# Altium footprint library mainlib.PcbLib: 95 footprints (part 4 of 6)
Each footprint in its own frame and in the unit in brackets; x right, y up, seen from the top. Pads: shape width x height; smd on the part's side, far side on the other; paste and mask are expansions set on the pad; w line width, h text height; cw(c..) or ccw(c..) is an arc to the next point about the centre after c.
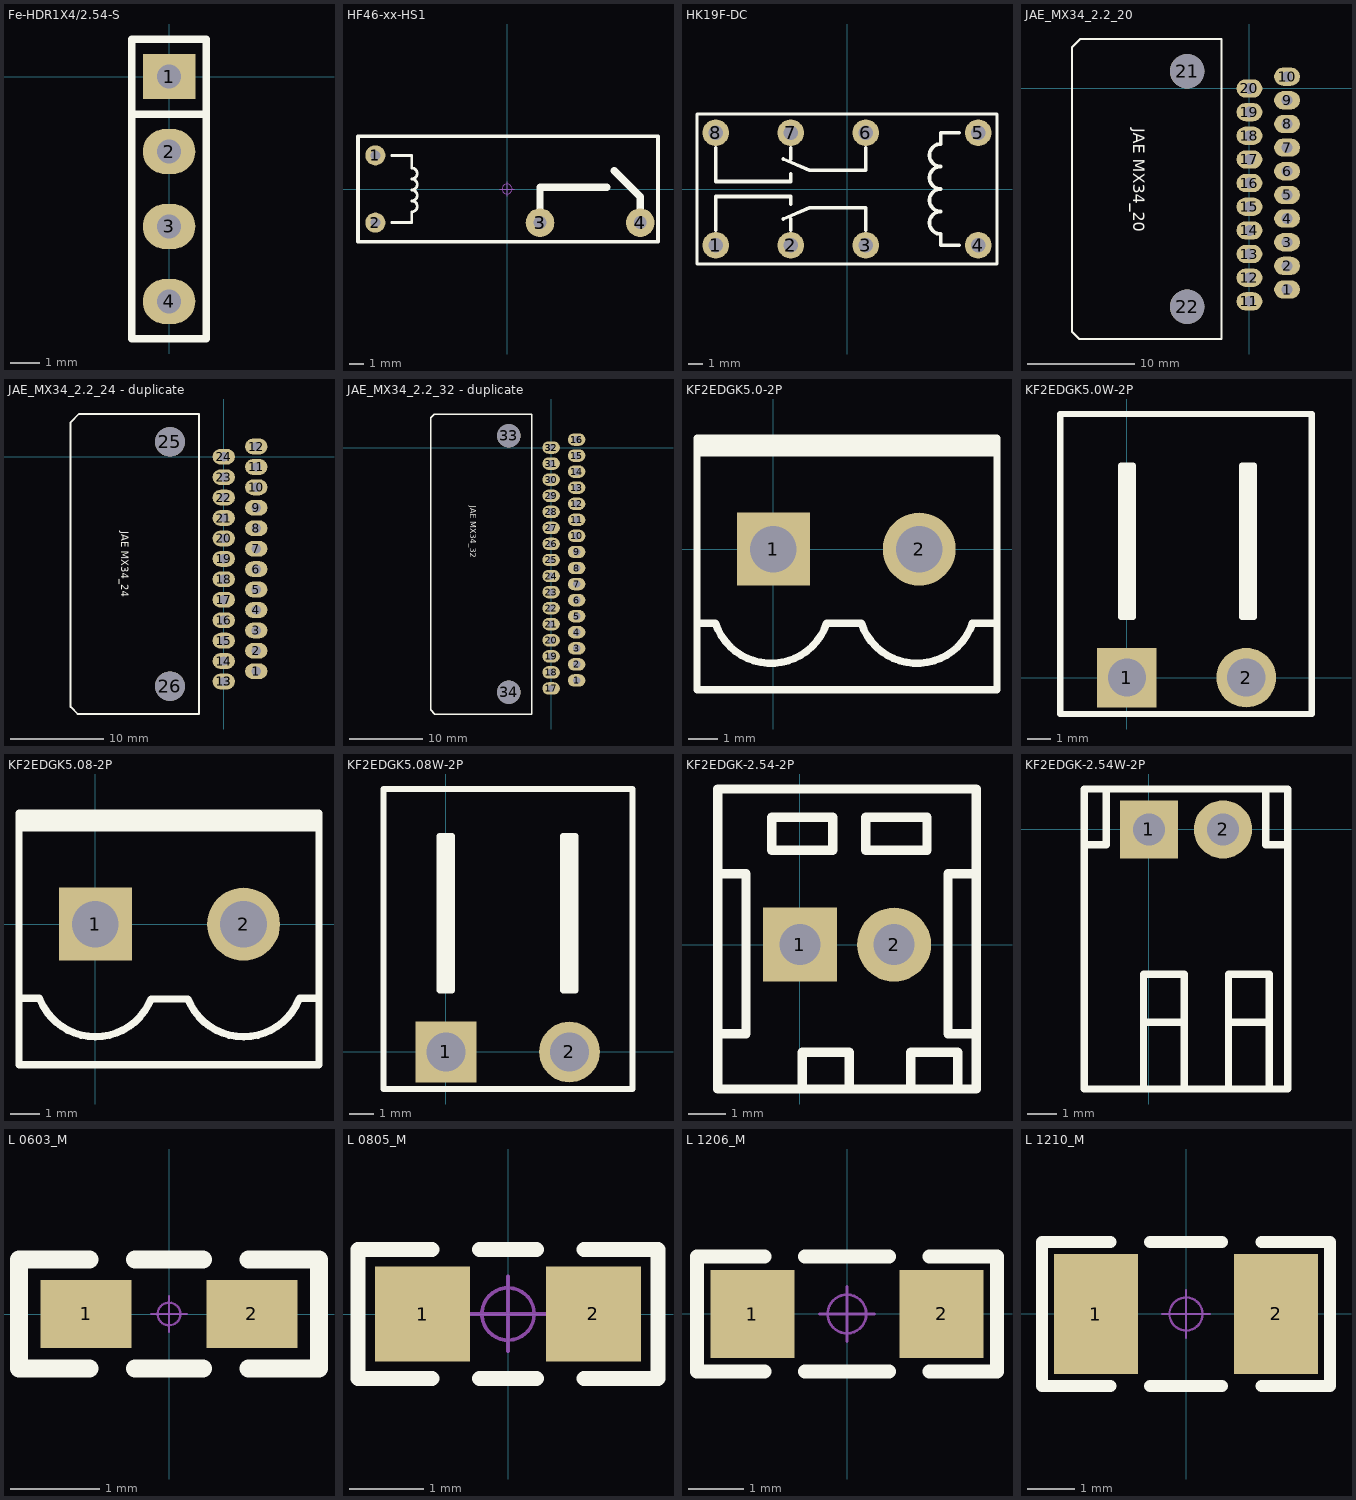
[diagram p3: the footprints below, top view; thin cyan lines are the x and y axes]

## Fe-HDR1X4/2.54-S [mil]
pads (4):
  rect 70x60 hole 32: 1(0,0)
  oval 70x60 hole 32: 2(0,-100) 3(0,-200) 4(0,-300)
Top Overlay:
  lines w10: -50,-50 50,-50 ; -50,-350 -50,50 50,50 50,-350 -50,-350
3D body "Female-Header-2.54-Single-4.stp": height 334.65, standoff -125.98, extent -44.21,-354.92 54.22,54.92

## HF46-xx-HS1 [mm] "一组常开，长：20.5mm，宽：7mm，高：15.3mm"
pads (4):
  round 1.4 hole 0.7: 1(-9.2,2.35) 2(-9.2,-2.35)
  round 2 hole 0.9: 3(2.3,-2.35) 4(9.3,-2.35)
Top Overlay:
  lines w0.2: -8.057,-2.35 -6.66,-2.35 -6.66,-1.59 ccw(c-6.66,-1.208) -6.66,-0.826 ccw(c-6.66,-0.444) -6.66,-0.062 ccw(c-6.66,0.32) -6.66,0.702 ccw(c-6.66,1.084) -6.66,1.466 -6.66,2.35 -8.057,2.35
  lines w0.254: -10.414,-3.683 10.541,-3.683 10.541,3.683 -10.414,3.683 -10.414,-3.683
  lines w0.508: 2.3,-2.35 2.3,0.113 2.314,0.127 6.985,0.127 ; 7.493,1.27 9.3,-0.537 9.3,-2.35
Mechanical 15:
  circle w0.05: c0,0 r0.35
  lines w0.05: -0.5,0 0.5,0 ; 0,-0.5 0,0.5
3D body "HF46-xx-HS1.STEP": height 15.3, standoff -2.6, extent -10.25,-3.5 10.25,3.5

## HK19F-DC [mm] "单刀双投，长：20.2mm，宽：10mm，高：12mm"
pads (8):
  round 1.8 hole 1: 1(-8.89,-3.81) 2(-3.81,-3.81) 3(1.27,-3.81) 4(8.89,-3.81) 5(8.89,3.81) 6(1.27,3.81) 7(-3.81,3.81) 8(-8.89,3.81)
Top Overlay:
  lines w0.2: -10.16,-5.08 -10.16,5.08 10.16,5.08 10.16,-5.08 -10.16,-5.08
  lines w0.254: -8.89,-2.794 -8.89,-0.508 -3.81,-0.508 -3.81,-1.016 ; -8.89,2.794 -8.89,0.508 -3.81,0.508 -3.81,1.016 ; -4.318,-2.032 -2.54,-1.27 1.27,-1.27 1.27,-2.794 ; -4.318,2.032 -2.54,1.27 1.27,1.27 1.27,2.794 ; -3.81,-2.794 -3.81,-2.032 ; -3.81,2.032 -3.81,2.794 ; 7.588,-3.81 6.35,-3.81 6.35,-3.048 cw(c6.35,-2.286) 6.35,-1.524 cw(c6.35,-0.762) 6.35,0 cw(c6.35,0.762) 6.35,1.524 cw(c6.35,2.286) 6.35,3.048 6.35,3.81 7.588,3.81
3D body "HK19F-DC-.STEP": height 11.85, standoff -3.25, extent -10.1,-5.047 10.1,4.953

## JAE_MX34_2.2_20 [mm]
pads (24):
  oval 2.4x1.7 hole 1: 1(3.5,-18.7) 1(3.5,-18.7) 2(3.5,-16.5) 3(3.5,-14.3) 4(3.5,-12.1) 5(3.5,-9.9) 6(3.5,-7.7) 7(3.5,-5.5) 8(3.5,-3.3) 9(3.5,-1.1) 10(3.5,1.1) 11(0,-19.8) 11(0,-19.8) 12(0,-17.6) 13(0,-15.4) 14(0,-13.2) 15(0,-11) 16(0,-8.8) 17(0,-6.6) 18(0,-4.4) 19(0,-2.2) 20(0,0)
  round 3.2 hole 3.2 unplated: 21(-5.8,1.6) 22(-5.8,-20.3)
Top Overlay:
  lines w0.2: -16.5,-22.616 -16.5,-1.1 -16.5,3.82 -15.72,4.6 -5.8,4.6 -2.608,4.6 -2.608,-23.3 -5.8,-23.3 -15.816,-23.3 -16.5,-22.616
  text "JAE MX34_20" at -10.795,-3.683 h1.1

## JAE_MX34_2.2_24 - duplicate [mm]
pads (28):
  oval 2.4x1.7 hole 1: 1(3.5,-23.1) 1(3.5,-23.1) 2(3.5,-20.9) 3(3.5,-18.7) 4(3.5,-16.5) 5(3.5,-14.3) 6(3.5,-12.1) 7(3.5,-9.9) 8(3.5,-7.7) 9(3.5,-5.5) 10(3.5,-3.3) 11(3.5,-1.1) 12(3.5,1.1) 13(0,-24.2) 13(0,-24.2) 14(0,-22) 15(0,-19.8) 16(0,-17.6) 17(0,-15.4) 18(0,-13.2) 19(0,-11) 20(0,-8.8) 21(0,-6.6) 22(0,-4.4) 23(0,-2.2) 24(0,0)
  round 3.2 hole 3.2 unplated: 25(-5.8,1.6) 26(-5.8,-24.7)
Top Overlay:
  lines w0.2: -16.5,-26.934 -15.734,-27.7 -2.653,-27.7 -2.653,4.6 -5.8,4.6 -15.593,4.6 -16.5,3.693 -16.5,-26.934
  text "JAE MX34_24" at -11.049,-8.001 h0.8
3D body "111.STEP": height 16.05, standoff -3.15, extent -22.883,-27.836 3.838,4.466

## JAE_MX34_2.2_32 - duplicate [mm]
pads (36):
  oval 2.4x1.7 hole 1: 1(3.5,-31.9) 2(3.5,-29.7) 3(3.5,-27.5) 4(3.5,-25.3) 5(3.5,-23.1) 6(3.5,-20.9) 7(3.5,-18.7) 8(3.5,-16.5) 9(3.5,-14.3) 10(3.5,-12.1) 11(3.5,-9.9) 12(3.5,-7.7) 13(3.5,-5.5) 14(3.5,-3.3) 15(3.5,-1.1) 16(3.5,1.1) 16(3.5,1.1) 17(0,-33) 18(0,-30.8) 19(0,-28.6) 20(0,-26.4) 21(0,-24.2) 22(0,-22) 23(0,-19.8) 24(0,-17.6) 25(0,-15.4) 26(0,-13.2) 27(0,-11) 28(0,-8.8) 29(0,-6.6) 30(0,-4.4) 31(0,-2.2) 32(0,0) 32(0,0)
  round 3.2 hole 3.2 unplated: 33(-5.8,1.6) 34(-5.8,-33.5)
Top Overlay:
  lines w0.2: -16.5,-35.951 -15.951,-36.5 -2.653,-36.5 -2.653,4.6 -5.8,4.6 -15.974,4.6 -16.5,4.074 -16.5,-35.951
  text "JAE MX34_32" at -11.049,-8.001 h0.8

## KF2EDGK5.0-2P [mm]
pads (2):
  rect 2.5x2.5 hole 1.6: 1(0,0)
  round 2.5 hole 1.6: 2(5,0)
Top Overlay:
  lines w0.254: -2.62,-2.54 -1.985,-2.54 ccw(c-0.08,-1.905) 1.825,-2.54 3.015,-2.54 ccw(c4.92,-1.905) 6.825,-2.54 7.667,-2.54 ; -2.62,3.302 7.667,3.302 ; -2.62,3.556 7.667,3.556 ; -2.62,-4.826 7.667,-4.826 7.667,3.81 -2.62,3.81 -2.62,-4.826
3D body "KF2EDGK5.0-LI.STEP": height 11.25, standoff -2.95, extent -2.54,-4.758 2.54,3.742
3D body "KF2EDGK5.0-LI.STEP": height 11.25, standoff -2.95, extent 2.46,-4.758 7.54,3.742

## KF2EDGK5.0W-2P [mm]
pads (2):
  rect 2.5x2.5 hole 1.6: 1(0,0)
  round 2.5 hole 1.6: 2(5,0)
Top Overlay:
  lines w0.254: 0,2.54 0,8.89 ; 5.08,2.54 5.08,8.89 ; 0,8.89 0.254,8.89 0.254,2.54 -0.254,2.54 -0.254,8.89 0,8.89 ; 5.08,8.89 5.334,8.89 5.334,2.54 4.826,2.54 4.826,8.89 5.08,8.89 ; -2.794,-1.524 7.747,-1.524 7.747,11.049 -2.794,11.049 -2.794,-1.524
3D body "KF2EDGK5.0-WI.STEP": height 8.5, standoff -3, extent 2.46,-0.57 7.54,10.73
3D body "KF2EDGK5.0-WI.STEP": height 8.5, standoff -3, extent -2.54,-0.57 2.54,10.73

## KF2EDGK5.08-2P [mm]
pads (2):
  rect 2.5x2.5 hole 1.6: 1(0,0)
  round 2.5 hole 1.6: 2(5.08,0)
Top Overlay:
  lines w0.254: -2.62,3.302 7.667,3.302 ; -2.62,3.556 7.667,3.556 ; -2.54,-2.54 -1.93,-2.54 ; -1.905,-2.565 ccw(c0,-1.812) 1.905,-2.565 2.54,-2.565 3.175,-2.565 ccw(c5.08,-1.812) 6.985,-2.565 ; 7.01,-2.54 7.62,-2.54 ; -2.62,-4.826 7.667,-4.826 7.667,3.81 -2.62,3.81 -2.62,-4.826
3D body "KF2EDGK5.08-LI.STEP": height 11.25, standoff -2.95, extent -2.54,-4.758 2.54,3.742
3D body "KF2EDGK5.08-LI.STEP": height 11.25, standoff -2.95, extent 2.54,-4.758 7.62,3.742

## KF2EDGK5.08W-2P [mm]
pads (2):
  rect 2.5x2.5 hole 1.6: 1(0,0)
  round 2.5 hole 1.6: 2(5.08,0)
Top Overlay:
  lines w0.254: 0,2.54 0,8.89 ; 5.08,2.54 5.08,8.89 ; 0,8.89 0.254,8.89 0.254,2.54 -0.254,2.54 -0.254,8.89 0,8.89 ; 5.08,8.89 4.826,8.89 4.826,2.54 5.334,2.54 5.334,8.89 5.08,8.89 ; -2.565,-1.524 7.671,-1.524 7.671,10.82 -2.565,10.82 -2.565,-1.524
3D body "KF2EDGK5.08-WI.STEP": height 8.5, standoff -3, extent 2.54,-0.57 7.62,10.73
3D body "KF2EDGK5.08-WI.STEP": height 8.5, standoff -3, extent -2.54,-0.57 2.54,10.73

## KF2EDGK-2.54-2P [mm]
pads (2):
  rect 2x2 hole 1.1: 1(0,0)
  round 2 hole 1.1: 2(2.54,0)
Top Overlay:
  lines w0.254: 0.066,-3.839 0.066,-2.912 1.336,-2.912 1.336,-3.839 ; 2.987,-3.839 2.987,-2.912 4.257,-2.912 4.257,-3.839 ; 4.76,-2.404 3.998,-2.404 3.998,1.914 4.76,1.914 ; -2.22,-2.404 -2.22,-3.9 4.76,-3.9 4.76,1.914 ; -2.22,-2.404 -1.458,-2.404 -1.458,1.914 -2.22,1.914 ; -2.22,-2.404 -2.22,1.914 ; -2.22,1.914 -2.22,4.2 4.76,4.2 4.76,1.914 ; -0.762,2.549 0.889,2.549 0.889,3.438 -0.762,3.438 -0.762,2.549 ; 1.778,2.549 1.778,3.438 3.429,3.438 3.429,2.549 1.778,2.549
3D body "KF2EDGK-2.54-2P.STEP": height 10.15, standoff -3.15, extent -2.22,-3.912 4.76,4.188

## KF2EDGK-2.54W-2P [mm]
pads (2):
  rect 2x2 hole 1.1: 1(0,0)
  round 2 hole 1.1: 2(2.54,0)
Top Overlay:
  lines w0.254: -2.22,-0.518 -1.463,-0.518 -1.463,1.387 ; -0.188,-8.9 -0.188,-4.963 1.209,-4.963 1.209,-8.9 ; -0.188,-6.614 1.209,-6.614 ; 2.728,-8.9 2.728,-4.963 4.125,-4.963 4.125,-8.9 ; 2.728,-6.614 4.125,-6.614 ; 4.003,1.387 4.003,-0.518 4.76,-0.518 ; -2.22,-8.9 -2.22,1.387 4.76,1.387 4.76,-8.9 -2.22,-8.9
3D body "KF2EDGK-2.54W-2P.STEP": height 8.15, standoff -3.25, extent -2.235,-8.911 4.745,1.189

## L 0603_M [mil] "小功率贴片电感"
pads (2):
  rect 40x30 smd: 1(-36.5,0) 2(36.5,0)
Top Overlay:
  lines w8: -35,-24 -66,-24 -66,24 -35,24 ; -15,-24 15,-24 ; -15,24 15,24 ; 35,-24 66,-24 66,24 35,24
Mechanical 15:
  circle w1: c0,0 r5
  lines w1: -7.87,0 7.88,0 ; 0,-7.87 0,7.88
3D body "0603.STEP": height 31.5, standoff -0.11, extent -31.49,-15.74 31.5,15.75

## L 0805_M [mm] "小功率贴片电感"
height 0.5
pads (2):
  rect 1.27x1.27 smd: 1(-1.143,0) 2(1.143,0)
Top Overlay:
  lines w0.203: -1.016,-0.864 -2.007,-0.864 -2.007,0.864 -1.016,0.864 ; -0.381,-0.864 0.381,-0.864 ; -0.381,0.864 0.381,0.864 ; 1.016,-0.864 2.007,-0.864 2.007,0.864 1.016,0.864
Mechanical 15:
  circle w0.05: c0,0 r0.35
  lines w0.05: -0.5,0 0.5,0 ; 0,-0.5 0,0.5
3D body "0805.STEP": height 0.9, standoff 0, extent -1,-0.6 1,0.6

## L 1206_M [mil] "小功率贴片电感"
pads (2):
  rect 60x62.99 smd: 1(-67.51,-0.01) 2(67.5,0)
Top Overlay:
  lines w10: -59,-41 -107,-41 -107,41 -59,41 ; -30,-41 30,-41 ; -30,41 30,41 ; 59,-41 107,-41 107,41 59,41
Mechanical 15:
  circle w1.97: c0,0 r13.78
  lines w1.97: -19.68,0 19.68,0 ; 0,-19.68 0,19.68
3D body "1206.STEP": height 35.43, standoff -0.19, extent -67.99,-31.5 57.99,31.5

## L 1210_M [mil] "小功率贴片电感"
pads (2):
  rect 70x100 smd: 1(-75,0) 2(75,0)
Top Overlay:
  lines w10: -63,-60 -120,-60 -120,60 -63,60 ; -30,-60 30,-60 ; -30,60 30,60 ; 63,-60 120,-60 120,60 63,60
Mechanical 15:
  circle w1.97: c0,0 r13.78
  lines w1.97: -19.68,0 19.68,0 ; 0,-19.68 0,19.68
3D body "1210.STEP": height 51.18, standoff -0.19, extent -62.99,-49.21 62.99,49.21